# Altium footprint library Connectors.PcbLib: 104 footprints (part 1 of 7)
Each footprint in its own frame and in the unit in brackets; x right, y up, seen from the top. Pads: shape width x height; smd on the part's side, far side on the other; paste and mask are expansions set on the pad; w line width, h text height; cw(c..) or ccw(c..) is an arc to the next point about the centre after c.
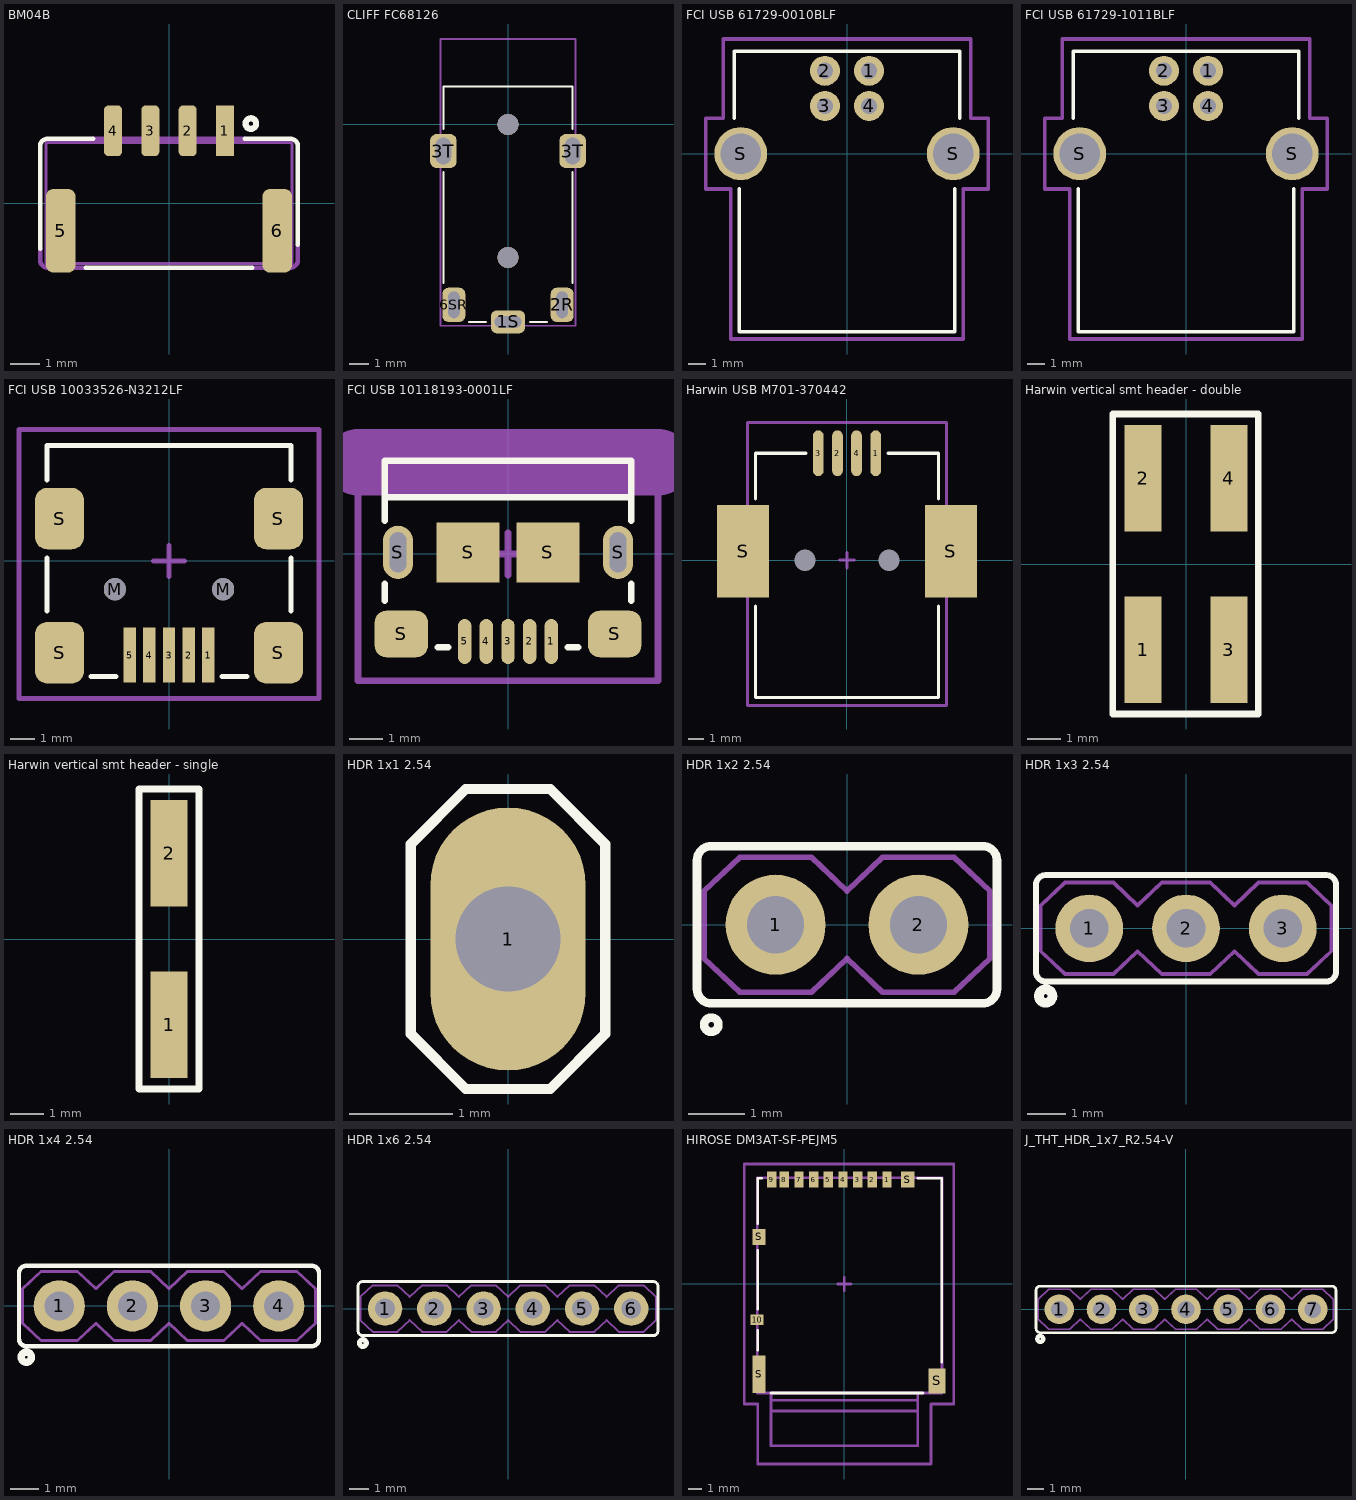
[diagram p0: the footprints below, top view; thin cyan lines are the x and y axes]

## BM04B [mm]
height 7.3
pads (6):
  rect 0.6x1.7 smd: 1(1.875,2.425)
  rrect50% 0.6x1.7 smd: 2(0.625,2.425) 3(-0.625,2.425) 4(-1.875,2.425)
  rrect50% 1x2.8 smd: 5(-3.625,-0.925) 6(3.625,-0.925)
Top Overlay:
  circle w0.203: c2.743,2.667 r0.178
  lines w0.152: -4.318,-1.524 -4.318,1.905 cw(c-4.064,1.905) -4.064,2.159 -2.54,2.159 ; -2.794,-2.159 2.794,-2.159 ; 2.54,2.159 4.064,2.159 cw(c4.064,1.905) 4.318,1.905 4.318,-1.397
Mechanical 4:
  lines w0.152: -4.318,-1.524 -4.318,-1.905 ccw(c-4.064,-1.905) -4.064,-2.159 -2.794,-2.159 ; -2.54,2.159 2.54,2.159 ; 2.794,-2.159 4.064,-2.159 ccw(c4.064,-1.905) 4.318,-1.905 4.318,-1.397
Mechanical 13:
  lines w0.1: -4.125,-2.025 4.125,-2.025 4.125,2.025 -4.125,2.025 -4.125,-2.025
3D body: height 4, standoff 0, extent -4.15,-2.02 4.12,2.02
3D body: height 0.2, standoff 0, extent -2.04,2.03 -1.74,2.73
3D body: height 0.2, standoff 0, extent -0.77,2.01 -0.47,2.71
3D body: height 0.2, standoff 0, extent 0.47,2.01 0.77,2.71
3D body: height 0.2, standoff 0, extent 1.73,2.02 2.03,2.72

## CLIFF FC68126 [mm] "Socket, Jack 3,5mm, female"
height 7.3
pads (5):
  rrect50% 1.8x1.2 hole 1.4 slot 0.6 at 90 deg: 1S(0,-10.4)
  rrect50% 1.2x1.8 hole 1.4 slot 0.6 at 0 deg: 2R(2.85,-9.5) 6SR(-2.85,-9.5)
  rrect50% 1.4x1.8 hole 1.4 slot 0.8 at 0 deg: 3T(-3.4,-1.4) 3T(3.4,-1.4)
via 0,0 diameter 1.1 hole 1.1
via 0,-7 diameter 1.1 hole 1.1
Top Overlay:
  lines w0.1: -3.4,-8.35 -3.4,-2.5 ; -3.4,-0.25 -3.4,2 3.4,2 3.4,-0.25 ; -2.05,-10.4 -1.15,-10.4 ; 1.15,-10.4 2.05,-10.4 ; 3.4,-8.35 3.4,-2.5
Mechanical 13:
  lines w0.1: -3.55,-10.6 -3.55,4.5 3.55,4.5 3.55,-10.6 -3.55,-10.6
3D body: height 6, standoff 0, extent -3.55,-10.6 3.55,2
3D body: height 6, standoff 0, extent -3,2 3,4.5
3D body: height 4.8, standoff 1.2, extent -1.8,2 1.8,4.5

## FCI USB 61729-0010BLF [mm]
height 11
pads (6):
  round 1.7 hole 0.92: 1(1.25,4.7) 2(-1.25,4.7) 3(-1.25,2.71) 4(1.25,2.71)
  round 3 hole 2.3: S(-6.02,0) S(6.02,0)
Top Overlay:
  lines w0.2: -6.4,2 -6.4,5.8 6.4,5.8 6.4,2 ; -6.1,-2 -6.1,-10.1 6.1,-10.1 6.1,-2
Mechanical 15:
  lines w0.2: -8,-2 -6.6,-2 -6.6,-10.5 0,-10.5 6.6,-10.5 6.6,-2 8,-2 8,2 7,2 7,6.5 0,6.5 -7,6.5 -7,2 -8,2 -8,-2
3D body "FCI 61729-0010BLF.STEP": height 11, standoff -2.8, extent -6.56,-10.175 6.56,5.765

## FCI USB 61729-1011BLF [mm]
height 11
pads (6):
  round 1.7 hole 0.92: 1(1.25,4.7) 2(-1.25,4.7) 3(-1.25,2.71) 4(1.25,2.71)
  round 3 hole 2.3: S(-6.02,0) S(6.02,0)
Top Overlay:
  lines w0.2: -6.4,2 -6.4,5.8 6.4,5.8 6.4,2 ; -6.1,-2 -6.1,-10.1 6.1,-10.1 6.1,-2
Mechanical 15:
  lines w0.2: -8,-2 -6.6,-2 -6.6,-10.5 0,-10.5 6.6,-10.5 6.6,-2 8,-2 8,2 7,2 7,6.5 0,6.5 -7,6.5 -7,2 -8,2 -8,-2
3D body "FCI 61729-1011BLF.STEP": height 11, standoff -2.8, extent -6.56,-10.175 6.56,5.765

## FCI USB 10033526-N3212LF [mm] "USB 2.0 Type B Mini"
height 3.95
pads (11):
  rect 0.5x2.25 smd: 1(1.6,-3.826) 2(0.8,-3.826) 3(0,-3.826) 4(-0.8,-3.826) 5(-1.6,-3.826)
  round 0.9 hole 0.9 unplated: M(-2.2,-1.151) M(2.2,-1.151)
  rrect50% 2x2.5 smd: S(-4.45,-3.731) S(-4.45,1.719) S(4.45,-3.731) S(4.45,1.719)
Top Overlay:
  lines w0.2: -4.953,-2.04 -4.953,0.119 ; -4.953,3.294 -4.953,4.691 4.953,4.691 4.953,3.294 ; -3.175,-4.707 -2.159,-4.707 ; 2.159,-4.707 3.175,-4.707 ; 4.953,-2.04 4.953,0.119
Mechanical 15:
  lines w0.2: -0.635,0 0.635,0 ; 0,-0.635 0,0.635 ; -6.096,-5.588 -6.096,5.334 6.096,5.334 6.096,-5.588 -6.096,-5.588
3D body "FCI USB 10033526-N3212LF.STEP": height 4.01, standoff -0.99, extent -4.95,-4.701 4.95,4.699

## FCI USB 10118193-0001LF [mm] "USB 2.0 Type B Micro"
height 3.1
pads (11):
  oval 0.4x1.35 smd: 1(1.3,-2.625) 2(0.65,-2.625) 3(0,-2.625) 4(-0.65,-2.625) 5(-1.3,-2.625)
  oval 0.9x1.6 hole 0.5 slot 1.2 at 90 deg: S(-3.3,0.05) S(3.3,0.05)
  rrect50% 1.6x1.4 smd: S(-3.2,-2.4) S(3.2,-2.4)
  rect 1.9x1.8 smd: S(-1.2,0.05) S(1.2,0.05)
Top Overlay:
  lines w0.2: -3.7,-1.4 -3.7,-0.9 ; -3.7,1 -3.7,1.7 ; -2.1,-2.8 -1.8,-2.8 ; 1.8,-2.8 2.1,-2.8 ; 3.7,-1.4 3.7,-0.9 ; 3.7,1 3.7,1.7 ; -3.7,1.7 -3.7,2.8 3.7,2.8 3.7,1.7 ; -3.7,1.7 3.7,1.7
Mechanical 15:
  lines w0.2: -0.635,0 0.635,0 ; 0,-0.635 0,0.635 ; -4.5,-3.8 4.5,-3.8 4.5,3.2 -4.5,3.2 -4.5,-3.8
Mechanical 31:
  lines w2: -4.5,2.754 0,2.754 4.5,2.754
3D body "FCI USB 10118193-0001lfc.STEP": height 2.78, standoff -0.82, extent -3.929,-2.9 3.928,2.76

## Harwin USB M701-370442 [mm]
height 11
pads (8):
  oval 0.7x3 smd: 1(1.875,7) 2(-0.625,7) 3(-1.875,7) 4(0.625,7)
  rect 0x0 hole 1.4 unplated: M(-2.75,0) M(2.75,0)
  rect 3.4x6.04 smd: S(-6.8,0.58) S(6.8,0.58)
Top Overlay:
  lines w0.2: -6,-3 -6,-9 0,-9 6,-9 6,-3 ; -6,4 -6,7 -2.7,7 ; 2.7,7 6,7 6,4
Mechanical 15:
  lines w0.2: -0.5,0 0.5,0 ; 0,-0.5 0,0.5 ; -6.5,-9.5 0,-9.5 6.5,-9.5 6.5,9 0,9 -6.5,9 -6.5,-9.5
3D body "Harwin M701-370442.STEP": height 11, standoff -1.5, extent -8.1,-9 8.1,8.15

## Harwin vertical smt header - double [mm]
height 11
pads (4):
  rect 1.1x3.15 smd: 1(-1.27,-2.54) 2(-1.27,2.54) 3(1.27,-2.54) 4(1.27,2.54)
Top Overlay:
  lines w0.2: -2.174,-4.445 2.144,-4.445 2.144,4.445 -2.174,4.445 -2.174,-4.445

## Harwin vertical smt header - single [mm]
height 11
pads (2):
  rect 1.1x3.15 smd: 1(0,-2.54) 2(0,2.54)
Top Overlay:
  lines w0.2: -0.889,-4.445 -0.889,4.445 0.889,4.445 0.889,-4.445 -0.889,-4.445

## HDR 1x1 2.54 [mm]
height 11.6
pads (1):
  oval 1.5x2.54 hole 1.016: 1(0,0)
Top Overlay:
  lines w0.1: -0.94,-0.914 -0.406,-1.448 0.406,-1.448 0.94,-0.914 0.94,0.914 0.406,1.448 -0.406,1.448 -0.94,0.914 -0.94,-0.914
Bottom Overlay:
  lines w0.1: -0.94,-0.914 -0.406,-1.448 0.406,-1.448 0.94,-0.914 0.94,0.914 0.406,1.448 -0.203,1.448 -0.406,1.448 -0.94,0.914 -0.94,-0.914
3D body: height 8.6, standoff -2.9, extent -0.3,-0.3 0.3,0.3

## HDR 1x2 2.54 [mil]
height 456.69
pads (2):
  round 70 hole 40: 1(-50,0) 2(50,0)
Top Overlay:
  circle w6: c-95,-70 r5
  lines w6: -105,-45 ccw(c-95,-45) -95,-55 95,-55 ccw(c95,-45) 105,-45 105,45 ccw(c95,45) 95,55 -95,55 ccw(c-95,45) -105,45 -105,-45
Mechanical 13:
  lines w3.94: -100,-23.62 -75,-47.24 -25,-47.24 0,-23.62 25,-47.24 75,-47.24 100,-23.62 100,23.62 75,47.24 25,47.24 0,23.62 -25,47.24 -75,47.24 -100,23.62 -100,-23.62
3D body: height 78.74, standoff 0, extent -100,-47.24 100,47.24
3D body: height 338.58, standoff -114.17, extent -61.81,-11.81 -38.19,11.81
3D body: height 338.58, standoff -114.17, extent 38.19,-11.81 61.81,11.81

## HDR 1x3 2.54 [mil]
height 456.69
pads (3):
  round 70 hole 40: 1(-100,0) 2(0,0) 3(100,0)
Top Overlay:
  circle w10: c-145,-70 r7
  lines w6: -155,-45 ccw(c-145,-45) -145,-55 145,-55 ccw(c145,-45) 155,-45 155,45 ccw(c145,45) 145,55 -145,55 ccw(c-145,45) -155,45 -155,-45
Mechanical 13:
  lines w3.94: -150,-23.62 -125,-47.24 -75,-47.24 -50,-23.62 -25,-47.24 25,-47.24 50,-23.62 75,-47.24 125,-47.24 150,-23.62 150,23.62 125,47.24 75,47.24 50,23.62 25,47.24 -25,47.24 -50,23.62 -75,47.24 -125,47.24 -150,23.62 -150,-23.62
3D body: height 338.58, standoff -114.17, extent -111.81,-11.81 -88.19,11.81
3D body: height 338.58, standoff -114.17, extent -11.81,-11.81 11.81,11.81
3D body: height 338.58, standoff -114.17, extent 88.19,-11.81 111.81,11.81
3D body: height 78.74, standoff 0, extent -150,-47.24 148.62,47.24

## HDR 1x4 2.54 [mil]
height 456.69
pads (4):
  round 70 hole 40: 1(-150,0) 2(-50,0) 3(50,0) 4(150,0)
Top Overlay:
  circle w10: c-195,-70 r7
  lines w6: -205,-45 ccw(c-195,-45) -195,-55 195,-55 ccw(c195,-45) 205,-45 205,45 ccw(c195,45) 195,55 -195,55 ccw(c-195,45) -205,45 -205,-45
Mechanical 1:
  lines w3.94: -200,-23.62 -175,-47.24 -125,-47.24 -100,-23.62 -75,-47.24 -25,-47.24 0,-23.62 25,-47.24 75,-47.24 100,-23.62 125,-47.24 175,-47.24 200,-23.62 200,23.62 175,47.24 125,47.24 100,23.62 75,47.24 25,47.24 0,23.62 -25,47.24 -75,47.24 -100,23.62 -125,47.24 -175,47.24 -200,23.62 -200,-23.62
3D body: height 338.58, standoff -114.17, extent -161.81,-11.81 -138.19,11.81
3D body: height 338.58, standoff -114.17, extent -61.81,-11.81 -38.19,11.81
3D body: height 338.58, standoff -114.17, extent 38.19,-11.81 61.81,11.81
3D body: height 338.58, standoff -114.17, extent 138.19,-11.81 161.81,11.81
3D body: height 78.74, standoff 0, extent -200,-47.24 200,47.24

## HDR 1x6 2.54 [mil]
height 456.69
pads (6):
  round 70 hole 40: 1(-250,0) 2(-150,0) 3(-50,0) 4(50,0) 5(150,0) 6(250,0)
Top Overlay:
  circle w10: c-295,-70 r7
  lines w6: -305,-45 ccw(c-295,-45) -295,-55 294.31,-55 ccw(c294.31,-45) 304.31,-45 304.31,45 ccw(c294.31,45) 294.31,55 -295,55 ccw(c-295,45) -305,45 -305,-45
Mechanical 1:
  lines w3.94: -300,-23.62 -300,23.62 -275,47.24 -225,47.24 -200,23.62 -175,47.24 -125,47.24 -100,23.62 -75,47.24 -25,47.24 0,23.62 25,47.24 75,47.24 100,23.62 125,47.24 175,47.24 200,23.62 225,47.24 275,47.24 300,23.62 300,-23.62 275,-47.24 225,-47.24 200,-23.62 175,-47.24 125,-47.24 100,-23.62 75,-47.24 25,-47.24 0,-23.62 -25,-47.24 -75,-47.24 -100,-23.62 -125,-47.24 -175,-47.24 -200,-23.62 -225,-47.24 -275,-47.24 -300,-23.62
3D body: height 338.58, standoff -114.17, extent 238.19,-11.81 261.81,11.81
3D body: height 338.58, standoff -114.17, extent 138.19,-11.81 161.81,11.81
3D body: height 338.58, standoff -114.17, extent 38.19,-11.81 61.81,11.81
3D body: height 338.58, standoff -114.17, extent -61.81,-11.81 -38.19,11.81
3D body: height 338.58, standoff -114.17, extent -161.81,-11.81 -138.19,11.81
3D body: height 338.58, standoff -114.17, extent -261.81,-11.81 -238.19,11.81
3D body: height 78.74, standoff 0, extent -300,-47.24 300,47.24

## HIROSE DM3AT-SF-PEJM5 [mm]
height 1.68
pads (14):
  rect 0.7x1.2 smd: 1(3.2,7.825) 2(2.1,7.825) 3(1,7.825) 4(-0.1,7.825) 5(-1.2,7.825) 6(-2.3,7.825) 7(-3.4,7.825) 8(-4.5,7.825) 9(-5.45,7.825)
  rect 1x0.8 smd: 10(-6.55,-2.675)
  rect 1x2.8 smd: S(-6.4,-6.775)
  rect 1x1.2 smd: S(-6.4,3.525) S(4.75,7.825)
  rect 1.3x1.9 smd: S(6.95,-7.275)
Top Overlay:
  lines w0.2: -6.5,-4.975 -6.5,-3.475 ; -6.5,-1.875 -6.5,2.525 ; -6.5,4.525 -6.5,7.925 -6.2,7.925 ; -5.5,-8.175 5.9,-8.175 ; 5.5,7.925 7.3,7.925 7.3,-5.875
Mechanical 13:
  lines w0.2: -5.5,-8.725 5.5,-8.725 ; -5.5,-8.175 -5.5,-9.525 ; 5.5,-8.175 5.5,-9.525 ; -5.5,-9.525 -5.5,-12.125 5.5,-12.125 5.5,-9.525 ; -5.5,-9.525 5.5,-9.525 ; -6.525,-8.175 -6.525,7.975 7.325,7.975 7.325,-8.175 -6.525,-8.175
Mechanical 15:
  lines w0.2: -0.5,0 0.5,0 ; 0,-0.5 0,0.5 ; -7.5,-9 -6.5,-9 -6.5,-13.5 6.5,-13.5 6.5,-9 8.2,-9 8.2,-8 8.2,9 -7.5,9 -7.5,-8.5 -7.5,-9
3D body "Hirose DM3AT-SF-PEJM5.STEP": height 1.68, standoff 0, extent -6.525,-8.175 7.325,7.975

## J_THT_HDR_1x7_R2.54-V [mil] "EMED"
height 456.69
pads (7):
  round 70 hole 40: 1(-300,0) 2(-200,0) 3(-100,0) 4(0,0) 5(100,0) 6(200,0) 7(300,0)
Top Overlay:
  circle w10: c-345,-70 r7
  lines w6: -355,-45 ccw(c-345,-45) -345,-55 345,-55 ccw(c345,-45) 355,-45 355,45 ccw(c345,45) 345,55 -345,55 ccw(c-345,45) -355,45 -355,-45
Mechanical 1:
  lines w3.94: -350,-23.62 -325,-47.24 -275,-47.24 -250,-23.62 -225,-47.24 -175,-47.24 -150,-23.62 -125,-47.24 -75,-47.24 -50,-23.62 -25,-47.24 25,-47.24 50,-23.62 75,-47.24 125,-47.24 150,-23.62 175,-47.24 225,-47.24 250,-23.62 275,-47.24 323.62,-47.24 348.62,-23.62 348.62,23.62 323.62,47.24 275,47.24 250,23.62 225,47.24 175,47.24 150,23.62 125,47.24 75,47.24 50,23.62 25,47.24 -25,47.24 -50,23.62 -75,47.24 -125,47.24 -150,23.62 -175,47.24 -225,47.24 -250,23.62 -275,47.24 -325,47.24 -350,23.62 -350,-23.62
3D body: height 78.74, standoff 0, extent -350,-47.24 348.62,47.24
3D body: height 338.58, standoff -114.17, extent -311.81,-11.81 -288.19,11.81
3D body: height 338.58, standoff -114.17, extent -211.81,-11.81 -188.19,11.81
3D body: height 338.58, standoff -114.17, extent -111.81,-11.81 -88.19,11.81
3D body: height 338.58, standoff -114.17, extent -11.81,-11.81 11.81,11.81
3D body: height 338.58, standoff -114.17, extent 88.19,-11.81 111.81,11.81
3D body: height 338.58, standoff -114.17, extent 188.19,-11.81 211.81,11.81
3D body: height 338.58, standoff -114.17, extent 288.19,-11.81 311.81,11.81